# Altium footprint library 电感.PcbLib: 109 footprints (part 4 of 7)
Each footprint in its own frame and in the unit in brackets; x right, y up, seen from the top. Pads: shape width x height; smd on the part's side, far side on the other; paste and mask are expansions set on the pad; w line width, h text height; cw(c..) or ccw(c..) is an arc to the next point about the centre after c.
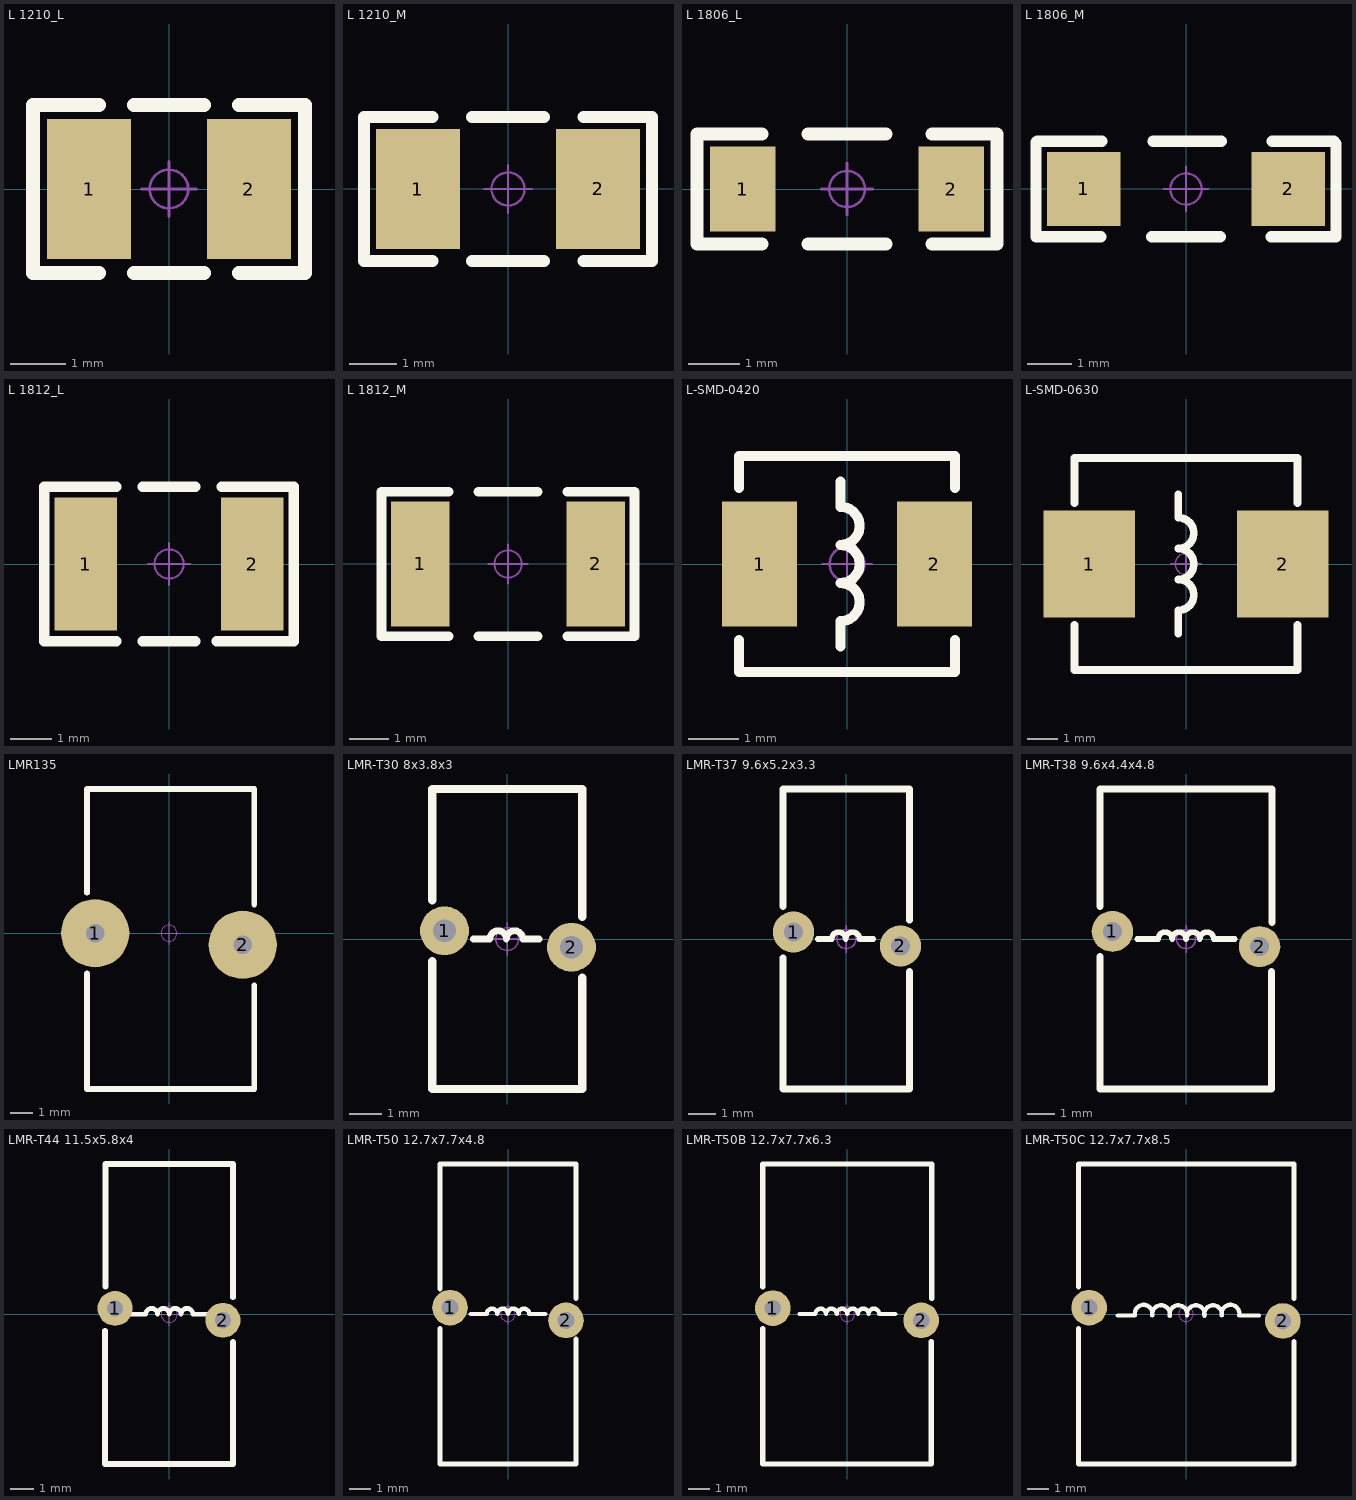
[diagram p3: the footprints below, top view; thin cyan lines are the x and y axes]

## L 1210_L [mm] "小功率贴片电感"
pads (2):
  rect 1.524x2.54 smd: 1(-1.45,0) 2(1.45,0)
Top Overlay:
  lines w0.254: -1.27,-1.524 -2.464,-1.524 -2.464,1.524 -1.27,1.524 ; -0.635,-1.524 0.635,-1.524 ; -0.635,1.524 0.635,1.524 ; 1.27,-1.524 2.464,-1.524 2.464,1.524 1.27,1.524
Mechanical 15:
  circle w0.05: c0,0 r0.35
  lines w0.05: -0.5,0 0.5,0 ; 0,-0.5 0,0.5
3D body: height 1.3, standoff 0, extent -1.6,-1.25 1.6,1.25

## L 1210_M [mil] "小功率贴片电感"
pads (2):
  rect 70x100 smd: 1(-75,0) 2(75,0)
Top Overlay:
  lines w10: -63,-60 -120,-60 -120,60 -63,60 ; -30,-60 30,-60 ; -30,60 30,60 ; 63,-60 120,-60 120,60 63,60
Mechanical 15:
  circle w1.97: c0,0 r13.78
  lines w1.97: -19.68,0 19.68,0 ; 0,-19.68 0,19.68
3D body: height 51.18, standoff -0.19, extent -62.99,-49.21 62.99,49.21

## L 1806_L [mil] "小功率贴片电感"
pads (2):
  rect 50x65 smd: 1(-80.01,-0.01) 2(80,0)
Top Overlay:
  lines w10: -65,-42 -115,-42 -115,42 ; -65,42 -115,42 ; -30,-42 30,-42 ; -30,42 30,42 ; 65,-42 115,-42 115,42 65,42 ; -115,42 -115,42
Mechanical 15:
  circle w1.97: c0,0 r13.78
  lines w1.97: -19.68,0 19.68,0 ; 0,-19.68 0,19.68
3D body: height 62.99, standoff -0.19, extent -88.58,-31.5 88.58,31.5

## L 1806_M [mil] "小功率贴片电感"
pads (2):
  rect 65x65 smd: 1(-89.99,0) 2(90.01,0)
Top Overlay:
  lines w10: -74.99,-42 -132,-42 -132,41 -131,42 -74,42 ; -29.99,-42.01 30.01,-42.01 ; -29,42 31,42 ; 75.01,-42.01 132,-42.01 132,39.99 130,41.99 76,41.99
Mechanical 15:
  circle w1.97: c0.01,0 r13.78
  lines w1.97: -19.68,0 19.69,0 ; 0.01,-19.68 0.01,19.68
3D body: height 62.99, standoff -0.19, extent -88.58,-31.5 88.59,31.5

## L 1812_L [mm] "小功率贴片电感"
pads (2):
  rect 1.5x3.2 smd: 1(-2,0) 2(2,0)
Top Overlay:
  lines w0.254: -1.27,-1.854 -2.997,-1.854 -2.997,1.854 -1.27,1.854 ; -0.635,-1.854 0.635,-1.854 ; -0.635,1.854 0.635,1.854 ; 1.143,-1.854 2.997,-1.854 2.997,1.854 1.27,1.854
Mechanical 15:
  circle w0.05: c0,0 r0.35
  lines w0.05: -0.5,0 0.5,0 ; 0,-0.5 0,0.5
3D body: height 1.5, standoff 0, extent -2.25,-1.6 2.25,1.6

## L 1812_M [mm] "小功率贴片电感"
pads (2):
  rect 1.5x3.2 smd: 1(-2.25,0) 2(2.25,0)
Top Overlay:
  lines w0.254: -1.524,-1.854 -3.251,-1.854 -3.251,1.854 -1.524,1.854 ; -0.762,-1.854 0.762,-1.854 ; -0.762,1.854 0.762,1.854 ; 1.524,-1.854 3.251,-1.854 3.251,1.854 1.524,1.854
Mechanical 15:
  circle w0.05: c0,0 r0.35
  lines w0.05: -0.5,0 0.5,0 ; 0,-0.5 0,0.5
3D body: height 1.5, standoff 0, extent -2.25,-1.6 2.25,1.6

## L-SMD-0420 [mm] "一体化成型电感"
pads (2):
  rect 1.5x2.5 smd: 1(-1.75,0) 2(1.75,0)
Top Overlay:
  lines w0.203: -2.159,-1.524 -2.159,-2.159 2.159,-2.159 2.159,-1.524 ; -2.159,1.524 -2.159,2.159 2.159,2.159 2.159,1.524 ; -0.127,-1.651 -0.127,-1.143 ccw(c-0.127,-0.762) -0.127,-0.381 ccw(c-0.127,0) -0.127,0.381 ccw(c-0.127,0.762) -0.127,1.143 -0.127,1.651
Mechanical 15:
  circle w0.05: c0,0 r0.35
  lines w0.05: -0.5,0 0.5,0 ; 0,-0.5 0,0.5
3D body: height 2.05, standoff 0.02, extent -2.25,-2.05 2.25,2.05

## L-SMD-0630 [mm] "一体化成型电感"
pads (2):
  rect 3x3.5 smd: 1(-3.175,0) 2(3.175,0)
Top Overlay:
  lines w0.254: -3.658,-2.007 -3.658,-3.48 3.658,-3.48 3.658,-2.007 ; -3.658,2.007 -3.658,3.48 3.658,3.48 3.658,2.007 ; -0.254,-2.286 -0.254,-1.524 ccw(c-0.254,-1.016) -0.254,-0.508 ccw(c-0.254,0) -0.254,0.508 ccw(c-0.254,1.016) -0.254,1.524 -0.254,2.286
Mechanical 15:
  circle w0.05: c0,0 r0.35
  lines w0.05: -0.5,0 0.5,0 ; 0,-0.5 0,0.5
3D body: height 3.05, standoff 0.02, extent -3.475,-3.3 3.475,3.3

## LMR135 [mm] "磁环电感，外径13mm，厚度5mm"
pads (2):
  round 3 hole 0.8: 1(-3.25,0) 2(3.25,-0.508)
Top Overlay:
  lines w0.254: -3.608,-1.778 -3.608,-6.858 3.758,-6.858 3.758,-2.286 ; -3.608,1.778 -3.608,6.35 3.758,6.35 3.758,1.27
Mechanical 15:
  circle w0.05: c0,0 r0.35
  lines w0.05: -0.5,0 0.5,0 ; 0,-0.5 0,0.5
3D body: height 12.5, standoff -3.51, extent -3.448,-6.755 3.553,6.248

## LMR-T30 8x3.8x3 [mm] "磁环  外：8mm，内：3.8mm，厚：3mm"
pads (2):
  oval 1.51x1.5 hole 0.7: 1(-1.93,0.254) 2(1.981,-0.254)
Top Overlay:
  lines w0.203: -1.041,0 -0.533,0 cw(c-0.279,0) -0.025,0 cw(c0.229,0) 0.483,0 0.991,0
  lines w0.254: -2.311,-0.686 -2.311,-4.623 2.311,-4.623 2.311,-1.194 ; -2.311,1.194 -2.311,4.623 2.311,4.623 2.311,0.686
Mechanical 15:
  circle w0.05: c0,0 r0.35
  lines w0.05: -0.5,0 0.5,0 ; 0,-0.5 0,0.5
3D body: height 9.53, standoff -2.3, extent -2.181,-4.49 2.184,4.49
3D body: height 0.25, standoff 0, extent 0.33,0.051 0.33,0.051

## LMR-T37 9.6x5.2x3.3 [mm] "磁环  外：9.6mm，内：5.2mm，厚：3.3mm"
pads (2):
  oval 1.51x1.5 hole 0.7: 1(-1.93,0.254) 2(1.981,-0.254)
Top Overlay:
  lines w0.203: -1.041,0 -0.533,0 cw(c-0.279,0) -0.025,0 cw(c0.229,0) 0.483,0 0.991,0
  lines w0.254: -2.311,-0.686 -2.311,-5.486 2.311,-5.486 2.311,-1.194 ; -2.311,1.194 -2.311,5.486 2.311,5.486 2.311,0.686
Mechanical 15:
  circle w0.05: c0,0 r0.35
  lines w0.05: -0.5,0 0.5,0 ; 0,-0.5 0,0.5
3D body: height 10.79, standoff -2.3, extent -2.242,-5.358 2.243,5.358
3D body: height 0.25, standoff 0, extent 0.33,0.051 0.33,0.051

## LMR-T38 9.6x4.4x4.8 [mm] "磁环  外：9.6mm，内：4.4mm，厚：4.8mm"
pads (2):
  oval 1.51x1.5 hole 0.7: 1(-2.692,0.279) 2(2.692,-0.279)
Top Overlay:
  lines w0.203: -1.778,0 -1.016,0 cw(c-0.762,0) -0.508,0 cw(c-0.254,0) 0,0 cw(c0.254,0) 0.508,0 cw(c0.762,0) 1.016,0 1.778,0
  lines w0.254: -3.15,-0.635 -3.15,-5.486 3.124,-5.486 3.124,-1.194 ; -3.15,1.194 -3.15,5.486 3.15,5.486 3.15,0.61
Mechanical 15:
  circle w0.05: c0,0 r0.35
  lines w0.05: -0.5,0 0.5,0 ; 0,-0.5 0,0.5
3D body: height 0.25, standoff 0, extent 0.33,0.051 0.33,0.051
3D body: height 10.79, standoff -2.3, extent -2.995,-5.34 2.994,5.344

## LMR-T44 11.5x5.8x4 [mm] "磁环  外：11.5mm，内：5.8mm，厚：4mm"
pads (2):
  oval 1.51x1.5 hole 0.7: 1(-2.337,0.254) 2(2.311,-0.254)
Top Overlay:
  lines w0.203: -1.778,0 -1.016,0 cw(c-0.762,0) -0.508,0 cw(c-0.254,0) 0,0 cw(c0.254,0) 0.508,0 cw(c0.762,0) 1.016,0 1.778,0
  lines w0.254: -2.769,-0.711 -2.769,-6.452 2.743,-6.452 2.743,-1.194 ; -2.743,1.194 -2.743,6.477 2.743,6.477 2.743,0.737
Mechanical 15:
  circle w0.05: c0,0 r0.35
  lines w0.05: -0.5,0 0.5,0 ; 0,-0.5 0,0.5
3D body: height 12.69, standoff -2.3, extent -2.593,-6.312 2.592,6.312
3D body: height 0.25, standoff 0, extent 0.33,0.051 0.33,0.051

## LMR-T50 12.7x7.7x4.8 [mm] "磁环  外：12.7mm，内：7.7mm，厚：4.8mm"
pads (2):
  round 1.7 hole 0.8: 1(-2.769,0.305) 2(2.769,-0.305)
Top Overlay:
  lines w0.203: -1.778,0 -1.016,0 cw(c-0.762,0) -0.508,0 cw(c-0.254,0) 0,0 cw(c0.254,0) 0.508,0 cw(c0.762,0) 1.016,0 1.778,0
  lines w0.254: -3.251,-0.711 -3.251,-7.163 3.251,-7.163 3.251,-1.194 ; -3.251,1.194 -3.251,7.163 3.251,7.163 3.251,0.737
Mechanical 15:
  circle w0.05: c0,0 r0.35
  lines w0.05: -0.5,0 0.5,0 ; 0,-0.5 0,0.5
3D body: height 0.25, standoff 0, extent 0.33,0.051 0.33,0.051
3D body: height 14.13, standoff -2.3, extent -3.112,-7.033 3.11,7.033

## LMR-T50B 12.7x7.7x6.3 [mm] "磁环  外：12.7mm，内：7.7mm，厚：6.3mm"
pads (2):
  round 1.7 hole 0.8: 1(-3.556,0.279) 2(3.531,-0.305)
Top Overlay:
  lines w0.203: -2.286,0 -1.524,0 cw(c-1.27,0) -1.016,0 cw(c-0.762,0) -0.508,0 cw(c-0.254,0) 0,0 cw(c0.254,0) 0.508,0 cw(c0.762,0) 1.016,0 cw(c1.27,0) 1.524,0 2.286,0
  lines w0.254: -4.039,-0.711 -4.039,-7.163 4.013,-7.163 4.013,-1.321 ; -4.039,1.295 -4.039,7.163 4.039,7.163 4.039,0.737
Mechanical 15:
  circle w0.05: c0,0 r0.35
  lines w0.05: -0.5,0 0.5,0 ; 0,-0.5 0,0.5
3D body: height 14.28, standoff -2.3, extent -3.891,-7.06 3.887,7.061
3D body: height 0.25, standoff 0, extent 0.33,0.051 0.33,0.051

## LMR-T50C 12.7x7.7x8.5 [mm] "磁环  外：12.7mm，内：7.7mm，厚：8.5mm"
pads (2):
  round 1.7 hole 0.8: 1(-4.623,0.305) 2(4.623,-0.33)
Top Overlay:
  lines w0.203: -3.262,-0.076 -2.442,-0.076 ; -2.442,-0.054 cw(c-2.024,0.016) -1.611,-0.076 cw(c-1.193,-0.007) -0.78,-0.098 cw(c-0.367,-0.007) 0.051,-0.076 cw(c0.468,-0.007) 0.882,-0.098 cw(c1.295,-0.007) 1.712,-0.076 cw(c2.126,0.016) 2.543,-0.054 ; 2.543,-0.076 3.49,-0.076
  lines w0.254: -5.131,-0.711 -5.131,-7.163 5.156,-7.163 5.156,-1.321 ; -5.131,1.295 -5.131,7.163 5.156,7.163 5.156,0.737
Mechanical 15:
  circle w0.05: c0,0 r0.35
  lines w0.05: -0.5,0 0.5,0 ; 0,-0.5 0,0.5
3D body: height 0.25, standoff 0, extent 0.33,0.051 0.33,0.051
3D body: height 14.28, standoff -2.3, extent -4.986,-7.065 4.986,7.065